# Altium footprint library Connektor.PcbLib: 305 footprints (part 15 of 20)
Each footprint in its own frame and in the unit in brackets; x right, y up, seen from the top. Pads: shape width x height; smd on the part's side, far side on the other; paste and mask are expansions set on the pad; w line width, h text height; cw(c..) or ccw(c..) is an arc to the next point about the centre after c.
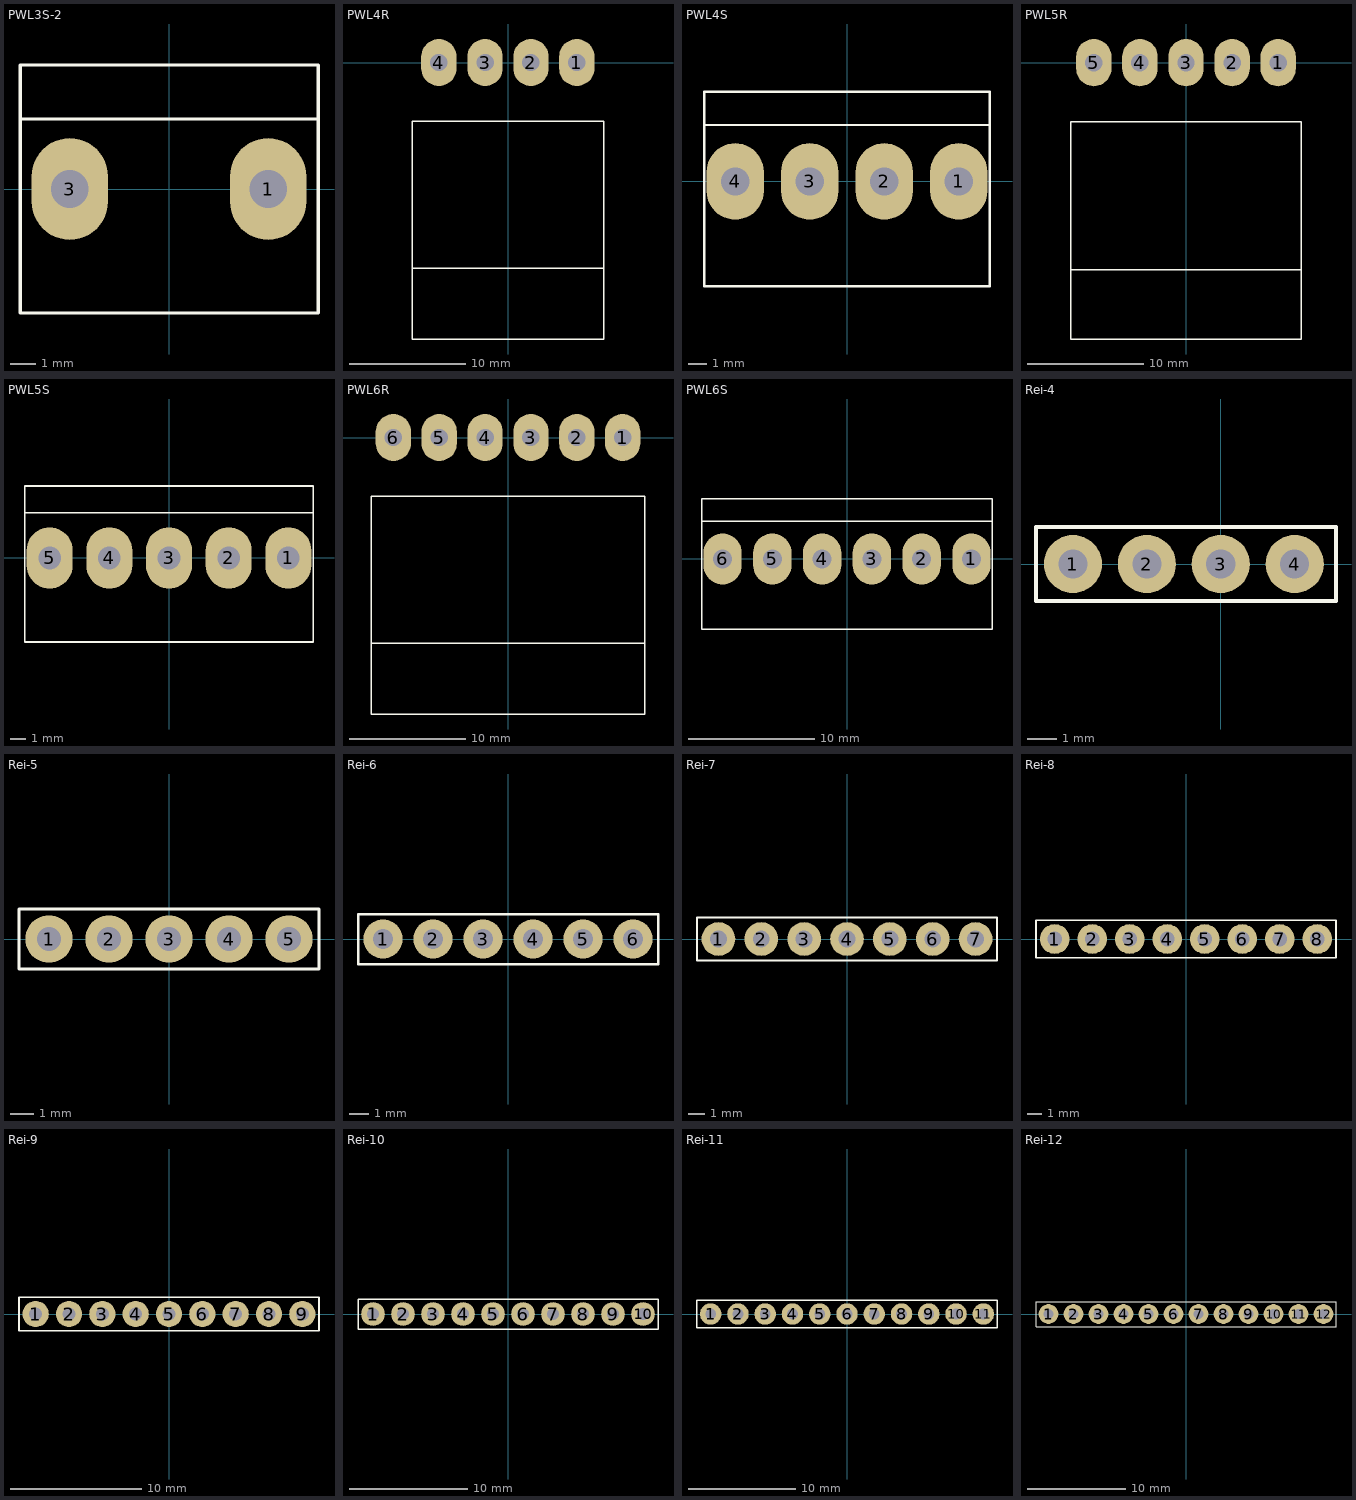
[diagram p14: the footprints below, top view; thin cyan lines are the x and y axes]

## PWL3S-2 [mm]
pads (2):
  oval 3.048x4.064 hole 1.5: 1(3.96,0) 3(-3.96,0)
TopOverlay:
  lines w0.127: -5.842,2.794 5.969,2.794 ; -5.94,-4.95 -5.94,4.95 5.963,4.95 5.963,-4.95 -5.94,-4.95

## PWL4R [mil]
pads (4):
  oval 120x160 hole 59.06: 1(233.86,0) 2(77.95,0) 3(-77.95,0) 4(-235,0)
TopOverlay:
  lines w5: -325,-700 325,-700 ; -325,-940 325,-940 325,-200 -325,-200 -325,-940

## PWL4S [mm]
pads (4):
  oval 3.048x4.064 hole 1.5: 1(5.94,0) 2(1.98,0) 3(-1.98,0) 4(-5.94,0)
TopOverlay:
  lines w0.127: -7.59,3 7.59,3 ; -7.59,-5.575 -7.59,4.775 7.59,4.775 7.59,-5.575 -7.59,-5.575
3D body: height 15, standoff -4.5, extent -7.59,-5.575 7.59,4.775

## PWL5R [mil]
pads (5):
  oval 120x160 hole 59.06: 1(311.81,0) 2(155.91,0) 3(0,0) 4(-155.91,0) 5(-311.81,0)
TopOverlay:
  lines w5: -387.05,-700 390,-700 ; -390,-935 -390,-200 390,-200 390,-935 -390,-935

## PWL5S [mil]
pads (5):
  oval 120x160 hole 59.06: 1(311.81,0) 2(155.91,0) 3(0,0) 4(-155.91,0) 5(-311.81,0)
TopOverlay:
  lines w5: -374.02,118.11 374.02,118.11 ; -376.77,-219.48 376.78,-219.48 376.78,188 -376.77,188 -376.77,-219.48
3D body: height 590.55, standoff -177.17, extent -376.76,-219.48 376.78,188

## PWL6R [mm]
pads (6):
  oval 3.048x4.064 hole 1.5: 1(9.9,0) 2(5.94,0) 3(1.98,0) 4(-1.98,0) 5(-5.94,0) 6(-9.9,0)
TopOverlay:
  lines w0.127: -11.811,-17.78 11.811,-17.78 ; -11.811,-23.876 11.811,-23.876 11.811,-5.08 -11.811,-5.08 -11.811,-23.876

## PWL6S [mm]
pads (6):
  oval 3.048x4.064 hole 1.5: 1(9.9,0) 2(5.94,0) 3(1.98,0) 4(-1.98,0) 5(-5.94,0) 6(-9.9,0)
TopOverlay:
  lines w0.127: -11.55,3 11.55,3 ; -11.55,-5.575 11.55,-5.575 11.55,4.775 -11.55,4.775 -11.55,-5.575
3D body: height 15, standoff -4.5, extent -11.55,-5.575 11.55,4.775

## Rei-4 [mm]
pads (4):
  round 2 hole 1: 1(-5.08,0) 2(-2.54,0) 3(0,0) 4(2.54,0)
TopOverlay:
  lines w0.127: -6.35,-1.27 -6.35,1.27 3.96,1.27 3.96,-1.27 -6.35,-1.27

## Rei-5 [mm]
pads (5):
  round 2 hole 1: 1(-5.08,0) 2(-2.54,0) 3(0,0) 4(2.54,0) 5(5.08,0)
TopOverlay:
  lines w0.127: -6.35,-1.27 6.35,-1.27 6.35,1.27 -6.35,1.27 -6.35,-1.27

## Rei-6 [mm]
pads (6):
  round 2 hole 1: 1(-6.35,0) 2(-3.81,0) 3(-1.27,0) 4(1.27,0) 5(3.81,0) 6(6.35,0)
TopOverlay:
  lines w0.127: -7.62,-1.27 7.62,-1.27 7.62,1.27 -7.62,1.27 -7.62,-1.27

## Rei-7 [mm]
pads (7):
  round 2 hole 1: 1(-7.62,0) 2(-5.08,0) 3(-2.54,0) 4(0,0) 5(2.54,0) 6(5.08,0) 7(7.62,0)
TopOverlay:
  lines w0.127: -8.89,-1.27 8.89,-1.27 8.89,1.27 -8.89,1.27 -8.89,-1.27

## Rei-8 [mm]
pads (8):
  round 2 hole 1: 1(-8.89,0) 2(-6.35,0) 3(-3.81,0) 4(-1.27,0) 5(1.27,0) 6(3.81,0) 7(6.35,0) 8(8.89,0)
TopOverlay:
  lines w0.127: -10.16,-1.27 10.16,-1.27 10.16,1.27 -10.16,1.27 -10.16,-1.27

## Rei-9 [mm]
pads (9):
  round 2 hole 1: 1(-10.16,0) 2(-7.62,0) 3(-5.08,0) 4(-2.54,0) 5(0,0) 6(2.54,0) 7(5.08,0) 8(7.62,0) 9(10.16,0)
TopOverlay:
  lines w0.127: -11.43,-1.27 -11.43,1.27 11.43,1.27 11.43,-1.27 -11.43,-1.27

## Rei-10 [mm]
pads (10):
  round 2 hole 1: 1(-11.43,0) 2(-8.89,0) 3(-6.35,0) 4(-3.81,0) 5(-1.27,0) 6(1.27,0) 7(3.81,0) 8(6.35,0) 9(8.89,0) 10(11.43,0)
TopOverlay:
  lines w0.127: -12.7,-1.27 -12.7,1.27 12.7,1.27 12.7,-1.27 -12.7,-1.27

## Rei-11 [mm]
pads (11):
  round 2 hole 1: 1(-12.7,0) 2(-10.16,0) 3(-7.62,0) 4(-5.08,0) 5(-2.54,0) 6(0,0) 7(2.54,0) 8(5.08,0) 9(7.62,0) 10(10.16,0) 11(12.7,0)
TopOverlay:
  lines w0.127: -13.97,-1.27 13.97,-1.27 13.97,1.27 -13.97,1.27 -13.97,-1.27

## Rei-12 [mm]
pads (12):
  round 2 hole 1: 1(-13.97,0) 2(-11.43,0) 3(-8.89,0) 4(-6.35,0) 5(-3.81,0) 6(-1.27,0) 7(1.27,0) 8(3.81,0) 9(6.35,0) 10(8.89,0) 11(11.43,0) 12(13.97,0)
TopOverlay:
  lines w0.127: -15.24,-1.27 -15.24,1.27 15.24,1.27 15.24,-1.27 -15.24,-1.27